# Altium footprint library WR-TBL_Pluggable PCB Header.PcbLib: 719 footprints (part 1 of 45)
Each footprint in its own frame and in the unit in brackets; x right, y up, seen from the top. Pads: shape width x height; smd on the part's side, far side on the other; paste and mask are expansions set on the pad; w line width, h text height; cw(c..) or ccw(c..) is an arc to the next point about the centre after c.
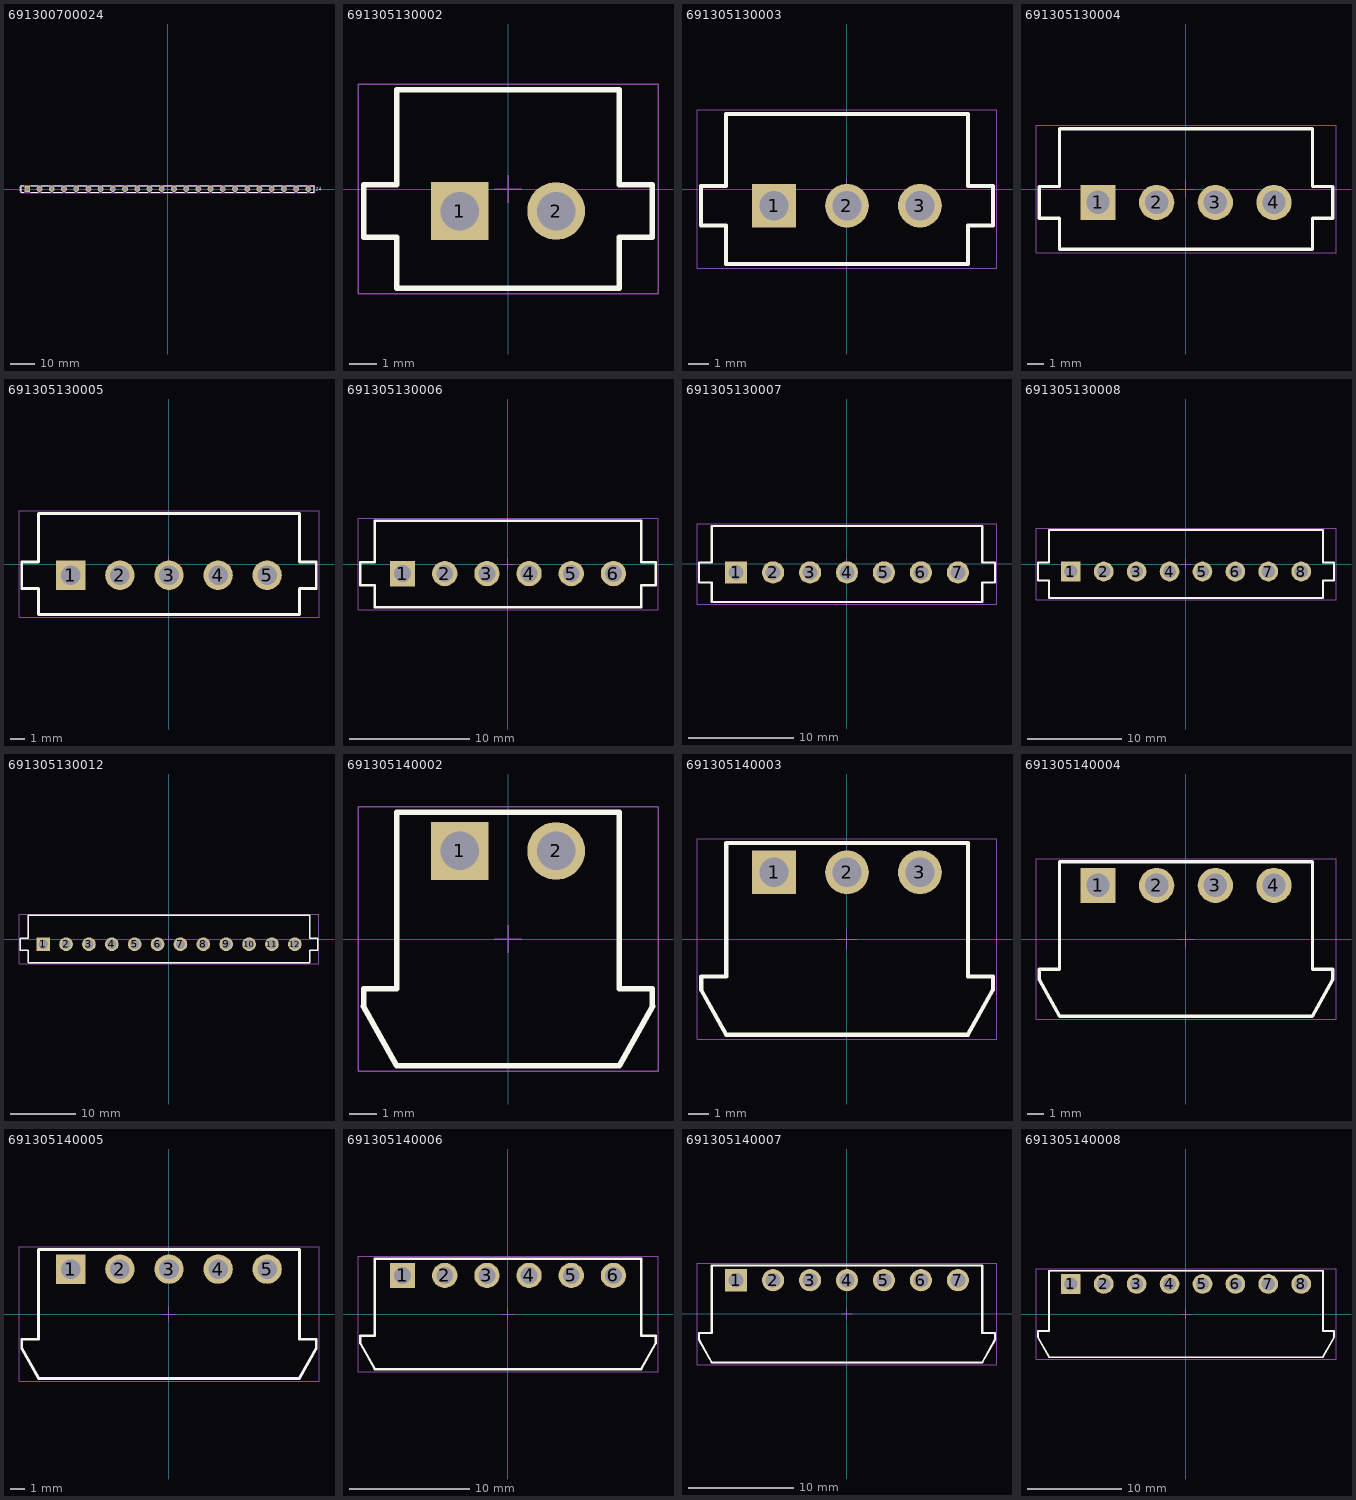
[diagram p0: the footprints below, top view; thin cyan lines are the x and y axes]

## 691300700024 [mm] "5.0mm pin header - 24p"
height 8.95
pads (24):
  rect 2.4x2.4 hole 1.6: 1(-57.5,0)
  round 2.4 hole 1.6: 2(-52.5,0) 3(-47.5,0) 4(-42.5,0) 5(-37.5,0) 6(-32.5,0) 7(-27.5,0) 8(-22.5,0) 9(-17.5,0) 10(-12.5,0) 11(-7.5,0) 12(-2.5,0) 13(2.5,0) 14(7.5,0) 15(12.5,0) 16(17.5,0) 17(22.5,0) 18(27.5,0) 19(32.5,0) 20(37.5,0) 21(42.5,0) 22(47.5,0) 23(52.5,0) 24(57.5,0)
Top Overlay:
  lines w0.2: -59,-1.35 -60,-1.35 -60,1.35 -59,1.35 ; -56,-1.35 -53.2,-1.35 ; -56,1.35 -53.2,1.35 ; -51.8,-1.35 -48.2,-1.35 ; -51.8,1.35 -48.2,1.35 ; -46.8,-1.35 -43.2,-1.35 ; -46.8,1.35 -43.2,1.35 ; -41.8,-1.35 -38.2,-1.35 ; -41.8,1.35 -38.2,1.35 ; -36.8,-1.35 -33.2,-1.35 ; -36.8,1.35 -33.2,1.35 ; -31.8,-1.35 -28.2,-1.35 ; -31.8,1.35 -28.2,1.35 ; -26.8,-1.35 -23.2,-1.35 ; -26.8,1.35 -23.2,1.35 ; -21.8,-1.35 -18.2,-1.35 ; -21.8,1.35 -18.2,1.35 ; -16.8,-1.35 -13.2,-1.35 ; -16.8,1.35 -13.2,1.35 ; -11.8,-1.35 -8.2,-1.35 ; -11.8,1.35 -8.2,1.35 ; -6.8,-1.35 -3.2,-1.35 ; -6.8,1.35 -3.2,1.35 ; -1.8,-1.35 1.8,-1.35 ; -1.8,1.35 1.8,1.35 ; 3.2,-1.35 6.8,-1.35 ; 3.2,1.35 6.8,1.35 ; 8.2,-1.35 11.8,-1.35 ; 8.2,1.35 11.8,1.35 ; 13.2,-1.35 16.8,-1.35 ; 13.2,1.35 16.8,1.35 ; 18.2,-1.35 21.8,-1.35 ; 18.2,1.35 21.8,1.35 ; 23.2,-1.35 26.8,-1.35 ; 23.2,1.35 26.8,1.35 ; 28.2,-1.35 31.8,-1.35 ; 28.2,1.35 31.8,1.35 ; 33.2,-1.35 36.8,-1.35 ; 33.2,1.35 36.8,1.35 ; 38.2,-1.35 41.8,-1.35 ; 38.2,1.35 41.8,1.35 ; 43.2,-1.35 46.8,-1.35 ; 43.2,1.35 46.8,1.35 ; 48.2,-1.35 51.8,-1.35 ; 48.2,1.35 51.8,1.35 ; 53.2,-1.35 56.8,-1.35 ; 53.2,1.35 56.8,1.35 ; 58.2,-1.35 60,-1.35 60,1.35 58.2,1.35
  text "24" at 60.6,-0.7 h1.27
  text "1" at -60.9,-0.7 h1.27
Mechanical 13:
  lines w0.1: 60,1.35 60,-1.35 -60,-1.35 -60,1.35 60,1.35 ; 60,1.35 60,1.35
Mechanical 15:
  lines w0.05: -0.5,0 0.5,0 ; 0,-0.5 0,0.5 ; -60.2,-1.55 60.2,-1.55 60.2,1.55 -60.2,1.55 -60.2,-1.55
3D body "691300700024.stp": height 9.05, standoff -3.45, extent -60,-1.35 60,1.35

## 691305130002 [mm] "Vertical PCB Header with Plastic Latch, pitch 3.5mm, 02p"
height 9.2
pads (2):
  rect 2.1x2.1 hole 1.4: 1(-1.75,-0.8)
  round 2.1 hole 1.4: 2(1.75,-0.8)
Top Overlay:
  lines w0.2: -5.25,-1.75 -5.25,0.15 -4.05,0.15 -4.05,3.6 4.05,3.6 4.05,0.15 5.25,0.15 5.25,-1.75 4.05,-1.75 4.05,-3.6 -4.05,-3.6 -4.05,-1.75 -5.25,-1.75
Mechanical 13:
  lines w0.1: -5.25,-1.75 -4.05,-1.75 -4.05,-3.6 4.05,-3.6 4.05,-1.75 5.25,-1.75 5.25,0.15 4.05,0.15 4.05,3.6 -4.05,3.6 -4.05,0.15 -5.25,0.15 -5.25,-1.75
Mechanical 15:
  lines w0.05: -0.5,0 0.5,0 ; 0,-0.5 0,0.5 ; -5.45,-3.8 -5.45,3.8 5.45,3.8 5.45,-3.8 -5.45,-3.8
3D body "691305130002.stp": height 9.25, standoff -3.45, extent -5.25,-3.6 5.25,3.6

## 691305130003 [mm] "Vertical PCB Header with Plastic Latch, pitch 3.5mm, 03p"
height 9.2
pads (3):
  rect 2.1x2.1 hole 1.4: 1(-3.5,-0.8)
  round 2.1 hole 1.4: 2(0,-0.8) 3(3.5,-0.8)
Top Overlay:
  lines w0.2: -7,-1.75 -7,0.15 -5.8,0.15 -5.8,3.6 5.8,3.6 5.8,0.15 7,0.15 7,-1.75 5.8,-1.75 5.8,-3.6 -5.8,-3.6 -5.8,-1.75 -7,-1.75
Mechanical 13:
  lines w0.1: -7,-1.75 -5.8,-1.75 -5.8,-3.6 5.8,-3.6 5.8,-1.75 7,-1.75 7,0.15 5.8,0.15 5.8,3.6 -5.8,3.6 -5.8,0.15 -7,0.15 -7,-1.75
Mechanical 15:
  lines w0.05: -0.5,0 0.5,0 ; 0,-0.5 0,0.5 ; -7.2,-3.8 -7.2,3.8 7.2,3.8 7.2,-3.8 -7.2,-3.8
3D body "691305130003.stp": height 9.25, standoff -3.5, extent -7,-3.6 7,3.6

## 691305130004 [mm] "Vertical PCB Header with Plastic Latch, pitch 3.5mm, 04p"
height 9.2
pads (4):
  rect 2.1x2.1 hole 1.4: 1(-5.25,-0.8)
  round 2.1 hole 1.4: 2(-1.75,-0.8) 3(1.75,-0.8) 4(5.25,-0.8)
Top Overlay:
  lines w0.2: -8.75,-1.75 -8.75,0.15 -7.55,0.15 -7.55,3.6 7.55,3.6 7.55,0.15 8.75,0.15 8.75,-1.75 7.55,-1.75 7.55,-3.6 -7.55,-3.6 -7.55,-1.75 -8.75,-1.75
Mechanical 13:
  lines w0.1: -8.75,-1.75 -7.55,-1.75 -7.55,-3.6 7.55,-3.6 7.55,-1.75 8.75,-1.75 8.75,0.15 7.55,0.15 7.55,3.6 -7.55,3.6 -7.55,0.15 -8.75,0.15 -8.75,-1.75
Mechanical 15:
  lines w0.05: -0.5,0 0.5,0 ; 0,-0.5 0,0.5 ; -8.95,-3.8 -8.95,3.8 8.95,3.8 8.95,-3.8 -8.95,-3.8
3D body "691305130004.stp": height 9.25, standoff -3.45, extent -8.75,-3.6 8.75,3.6

## 691305130005 [mm] "Vertical PCB Header with Plastic Latch, pitch 3.5mm, 05p"
height 9.2
pads (5):
  rect 2.1x2.1 hole 1.4: 1(-7,-0.8)
  round 2.1 hole 1.4: 2(-3.5,-0.8) 3(0,-0.8) 4(3.5,-0.8) 5(7,-0.8)
Top Overlay:
  lines w0.2: -10.5,-1.75 -10.5,0.15 -9.3,0.15 -9.3,3.6 9.3,3.6 9.3,0.15 10.5,0.15 10.5,-1.75 9.3,-1.75 9.3,-3.6 -9.3,-3.6 -9.3,-1.75 -10.5,-1.75
Mechanical 13:
  lines w0.1: -10.5,-1.75 -9.3,-1.75 -9.3,-3.6 9.3,-3.6 9.3,-1.75 10.5,-1.75 10.5,0.15 9.3,0.15 9.3,3.6 -9.3,3.6 -9.3,0.15 -10.5,0.15 -10.5,-1.75
Mechanical 15:
  lines w0.05: -0.5,0 0.5,0 ; 0,-0.5 0,0.5 ; -10.7,-3.8 -10.7,3.8 10.7,3.8 10.7,-3.8 -10.7,-3.8
3D body "691305130005.stp": height 9.25, standoff -3.5, extent -10.5,-3.6 10.5,3.6

## 691305130006 [mm] "Vertical PCB Header with Plastic Latch, pitch 3.5mm, 06p"
height 9.2
pads (6):
  rect 2.1x2.1 hole 1.4: 1(-8.75,-0.8)
  round 2.1 hole 1.4: 2(-5.25,-0.8) 3(-1.75,-0.8) 4(1.75,-0.8) 5(5.25,-0.8) 6(8.75,-0.8)
Top Overlay:
  lines w0.2: -12.25,-1.75 -12.25,0.15 -11.05,0.15 -11.05,3.6 11.05,3.6 11.05,0.15 12.25,0.15 12.25,-1.75 11.05,-1.75 11.05,-3.6 -11.05,-3.6 -11.05,-1.75 -12.25,-1.75
Mechanical 13:
  lines w0.1: -12.25,-1.75 -11.05,-1.75 -11.05,-3.6 11.05,-3.6 11.05,-1.75 12.25,-1.75 12.25,0.15 11.05,0.15 11.05,3.6 -11.05,3.6 -11.05,0.15 -12.25,0.15 -12.25,-1.75
Mechanical 15:
  lines w0.05: -0.5,0 0.5,0 ; 0,-0.5 0,0.5 ; -12.45,-3.8 -12.45,3.8 12.45,3.8 12.45,-3.8 -12.45,-3.8
3D body "691305130006.stp": height 9.25, standoff -3.5, extent -12.25,-3.6 12.25,3.6

## 691305130007 [mm] "Vertical PCB Header with Plastic Latch, pitch 3.5mm, 07p"
height 9.2
pads (7):
  rect 2.1x2.1 hole 1.4: 1(-10.5,-0.8)
  round 2.1 hole 1.4: 2(-7,-0.8) 3(-3.5,-0.8) 4(0,-0.8) 5(3.5,-0.8) 6(7,-0.8) 7(10.5,-0.8)
Top Overlay:
  lines w0.2: -14,-1.75 -12.8,-1.75 -12.8,-3.6 12.8,-3.6 12.8,-1.75 14,-1.75 14,0.15 12.8,0.15 12.8,3.6 -12.8,3.6 -12.8,0.15 -14,0.15 -14,-1.75
Mechanical 13:
  lines w0.1: -14,-1.75 -14,0.15 -12.8,0.15 -12.8,3.6 12.8,3.6 12.8,0.15 14,0.15 14,-1.75 12.8,-1.75 12.8,-3.6 -12.8,-3.6 -12.8,-1.75 -14,-1.75
Mechanical 15:
  lines w0.05: -0.5,0 0.5,0 ; 0,-0.5 0,0.5 ; -14.2,-3.8 14.2,-3.8 14.2,3.8 -14.2,3.8 -14.2,-3.8
3D body "691305130007.stp": height 9.25, standoff -3.45, extent -14,-3.6 14,3.6

## 691305130008 [mm] "Vertical PCB Header with Plastic Latch, pitch 3.5mm, 08p"
height 9.2
pads (8):
  rect 2.1x2.1 hole 1.4: 1(-12.25,-0.8)
  round 2.1 hole 1.4: 2(-8.75,-0.8) 3(-5.25,-0.8) 4(-1.75,-0.8) 5(1.75,-0.8) 6(5.25,-0.8) 7(8.75,-0.8) 8(12.25,-0.8)
Top Overlay:
  lines w0.2: -15.75,-1.75 -14.55,-1.75 -14.55,-3.6 14.55,-3.6 14.55,-1.75 15.75,-1.75 15.75,0.15 14.55,0.15 14.55,3.6 -14.55,3.6 -14.55,0.15 -15.75,0.15 -15.75,-1.75
Mechanical 13:
  lines w0.1: -15.75,-1.75 -15.75,0.15 -14.55,0.15 -14.55,3.6 14.55,3.6 14.55,0.15 15.75,0.15 15.75,-1.75 14.55,-1.75 14.55,-3.6 -14.55,-3.6 -14.55,-1.75 -15.75,-1.75
Mechanical 15:
  lines w0.05: -0.5,0 0.5,0 ; 0,-0.5 0,0.5 ; -15.95,-3.8 15.95,-3.8 15.95,3.8 -15.95,3.8 -15.95,-3.8
3D body "691305130008.stp": height 9.25, standoff -3.45, extent -15.75,-3.6 15.75,3.6

## 691305130012 [mm] "Vertical PCB Header with Plastic Latch, pitch 3.5mm, 12p"
height 9.2
pads (12):
  rect 2.1x2.1 hole 1.4: 1(-19.25,-0.8)
  round 2.1 hole 1.4: 2(-15.75,-0.8) 3(-12.25,-0.8) 4(-8.75,-0.8) 5(-5.25,-0.8) 6(-1.75,-0.8) 7(1.75,-0.8) 8(5.25,-0.8) 9(8.75,-0.8) 10(12.25,-0.8) 11(15.75,-0.8) 12(19.25,-0.8)
Top Overlay:
  lines w0.2: -22.75,-1.75 -22.75,0.15 -21.55,0.15 -21.55,3.6 21.55,3.6 21.55,0.15 22.75,0.15 22.75,-1.75 21.55,-1.75 21.55,-3.6 -21.55,-3.6 -21.55,-1.75 -22.75,-1.75
Mechanical 13:
  lines w0.1: -22.75,-1.75 -21.55,-1.75 -21.55,-3.6 21.55,-3.6 21.55,-1.75 22.75,-1.75 22.75,0.15 21.55,0.15 21.55,3.6 -21.55,3.6 -21.55,0.15 -22.75,0.15 -22.75,-1.75
Mechanical 15:
  lines w0.05: -0.5,0 0.5,0 ; 0,-0.5 0,0.5 ; -22.95,-3.8 -22.95,3.8 22.95,3.8 22.95,-3.8 -22.95,-3.8
3D body "691305130012.stp": height 9.25, standoff -3.45, extent -22.75,-3.6 22.75,3.6

## 691305140002 [mm] "Horizontal PCB Header with Plastic Latch, pitch 3.5mm, 02p"
height 7
pads (2):
  rect 2.1x2.1 hole 1.4: 1(-1.75,3.2)
  round 2.1 hole 1.4: 2(1.75,3.2)
Top Overlay:
  lines w0.2: -5.251,-2.451 -4.05,-4.6 4.05,-4.6 5.251,-2.451 ; -5.25,-2.45 -5.25,-1.8 -4.05,-1.8 -4.05,4.6 4.05,4.6 4.05,-1.8 5.25,-1.8 5.25,-2.45
Mechanical 13:
  lines w0.1: -5.251,-2.451 -4.05,-4.6 4.05,-4.6 5.251,-2.451 ; -5.25,-2.45 -5.25,-1.8 -4.05,-1.8 -4.05,4.6 4.05,4.6 4.05,-1.8 5.25,-1.8 5.25,-2.45
Mechanical 15:
  lines w0.05: -0.5,0 0.5,0 ; 0,-0.5 0,0.5 ; -5.45,-4.8 -5.45,4.8 5.45,4.8 5.45,-4.8 -5.45,-4.8
3D body "691305140002.stp": height 7.25, standoff -3.45, extent -5.25,-4.6 5.25,4.6

## 691305140003 [mm] "Horizontal PCB Header with Plastic Latch, pitch 3.5mm, 03p"
height 7
pads (3):
  rect 2.1x2.1 hole 1.4: 1(-3.5,3.2)
  round 2.1 hole 1.4: 2(0,3.2) 3(3.5,3.2)
Top Overlay:
  lines w0.2: -7.001,-2.451 -5.8,-4.6 5.8,-4.6 7.001,-2.451 ; -7,-2.45 -7,-1.8 -5.8,-1.8 -5.8,4.6 5.8,4.6 5.8,-1.8 7,-1.8 7,-2.45
Mechanical 13:
  lines w0.1: -7.001,-2.451 -5.8,-4.6 5.8,-4.6 7.001,-2.451 ; -7,-2.45 -7,-1.8 -5.8,-1.8 -5.8,4.6 5.8,4.6 5.8,-1.8 7,-1.8 7,-2.45
Mechanical 15:
  lines w0.05: -0.5,0 0.5,0 ; 0,-0.5 0,0.5 ; -7.2,-4.8 7.2,-4.8 7.2,4.8 -7.2,4.8 -7.2,-4.8
3D body "691305140003.stp": height 7.25, standoff -3.45, extent -7,-4.6 7,4.6

## 691305140004 [mm] "Horizontal PCB Header with Plastic Latch, pitch 3.5mm, 04p"
height 7
pads (4):
  rect 2.1x2.1 hole 1.4: 1(-5.25,3.2)
  round 2.1 hole 1.4: 2(-1.75,3.2) 3(1.75,3.2) 4(5.25,3.2)
Top Overlay:
  lines w0.2: -8.751,-2.451 -7.55,-4.6 7.55,-4.6 8.751,-2.451 ; -8.75,-2.45 -8.75,-1.8 -7.55,-1.8 -7.55,4.6 7.55,4.6 7.55,-1.8 8.75,-1.8 8.75,-2.45
Mechanical 13:
  lines w0.1: -8.751,-2.451 -7.55,-4.6 7.55,-4.6 8.751,-2.451 ; -8.75,-2.45 -8.75,-1.8 -7.55,-1.8 -7.55,4.6 7.55,4.6 7.55,-1.8 8.75,-1.8 8.75,-2.45
Mechanical 15:
  lines w0.05: -0.5,0 0.5,0 ; 0,-0.5 0,0.5 ; -8.95,-4.8 8.95,-4.8 8.95,4.8 -8.95,4.8 -8.95,-4.8
3D body "691305140004.stp": height 7.25, standoff -3.45, extent -8.75,-4.6 8.75,4.6

## 691305140005 [mm] "Horizontal PCB Header with Plastic Latch, pitch 3.5mm, 05p"
height 7
pads (5):
  rect 2.1x2.1 hole 1.4: 1(-7,3.2)
  round 2.1 hole 1.4: 2(-3.5,3.2) 3(0,3.2) 4(3.5,3.2) 5(7,3.2)
Top Overlay:
  lines w0.2: -10.501,-2.451 -9.3,-4.6 9.3,-4.6 10.501,-2.451 ; -10.5,-2.45 -10.5,-1.8 -9.3,-1.8 -9.3,4.6 9.3,4.6 9.3,-1.8 10.5,-1.8 10.5,-2.45
Mechanical 13:
  lines w0.1: -10.501,-2.451 -9.3,-4.6 9.3,-4.6 10.501,-2.451 ; -10.5,-2.45 -10.5,-1.8 -9.3,-1.8 -9.3,4.6 9.3,4.6 9.3,-1.8 10.5,-1.8 10.5,-2.45
Mechanical 15:
  lines w0.05: -0.5,0 0.5,0 ; 0,-0.5 0,0.5 ; -10.7,-4.8 10.7,-4.8 10.7,4.8 -10.7,4.8 -10.7,-4.8
3D body "691305140005.stp": height 7.25, standoff -3.45, extent -10.5,-4.6 10.5,4.6

## 691305140006 [mm] "Horizontal PCB Header with Plastic Latch, pitch 3.5mm, 06p"
height 7
pads (6):
  rect 2.1x2.1 hole 1.4: 1(-8.75,3.2)
  round 2.1 hole 1.4: 2(-5.25,3.2) 3(-1.75,3.2) 4(1.75,3.2) 5(5.25,3.2) 6(8.75,3.2)
Top Overlay:
  lines w0.2: -12.251,-2.451 -11.05,-4.6 11.05,-4.6 12.251,-2.451 ; -12.25,-2.45 -12.25,-1.8 -11.05,-1.8 -11.05,4.6 11.05,4.6 11.05,-1.8 12.25,-1.8 12.25,-2.45
Mechanical 13:
  lines w0.1: -12.251,-2.451 -11.05,-4.6 11.05,-4.6 12.251,-2.451 ; -12.25,-2.45 -12.25,-1.8 -11.05,-1.8 -11.05,4.6 11.05,4.6 11.05,-1.8 12.25,-1.8 12.25,-2.45
Mechanical 15:
  lines w0.05: -0.5,0 0.5,0 ; 0,-0.5 0,0.5 ; -12.45,-4.8 -12.45,4.8 12.45,4.8 12.45,-4.8 -12.45,-4.8
3D body "691305140006.stp": height 7.25, standoff -3.45, extent -12.25,-4.6 12.25,4.6

## 691305140007 [mm] "Horizontal PCB Header with Plastic Latch, pitch 3.5mm, 07p"
height 7
pads (7):
  rect 2.1x2.1 hole 1.4: 1(-10.5,3.2)
  round 2.1 hole 1.4: 2(-7,3.2) 3(-3.5,3.2) 4(0,3.2) 5(3.5,3.2) 6(7,3.2) 7(10.5,3.2)
Top Overlay:
  lines w0.2: -14.001,-2.451 -12.8,-4.6 12.8,-4.6 14.001,-2.451 ; -14,-2.45 -14,-1.8 -12.8,-1.8 -12.8,4.6 12.8,4.6 12.8,-1.8 14,-1.8 14,-2.45
Mechanical 13:
  lines w0.1: -14.001,-2.451 -12.8,-4.6 12.8,-4.6 14.001,-2.451 ; -14,-2.45 -14,-1.8 -12.8,-1.8 -12.8,4.6 12.8,4.6 12.8,-1.8 14,-1.8 14,-2.45
Mechanical 15:
  lines w0.05: -0.5,0 0.5,0 ; 0,-0.5 0,0.5 ; -14.2,-4.8 -14.2,4.8 14.2,4.8 14.2,-4.8 -14.2,-4.8
3D body "691305140007.stp": height 7.25, standoff -3.45, extent -14,-4.6 14,4.6

## 691305140008 [mm] "Horizontal PCB Header with Plastic Latch, pitch 3.5mm, 08p"
height 7
pads (8):
  rect 2.1x2.1 hole 1.4: 1(-12.25,3.2)
  round 2.1 hole 1.4: 2(-8.75,3.2) 3(-5.25,3.2) 4(-1.75,3.2) 5(1.75,3.2) 6(5.25,3.2) 7(8.75,3.2) 8(12.25,3.2)
Top Overlay:
  lines w0.2: -15.751,-2.451 -14.55,-4.6 14.55,-4.6 15.751,-2.451 ; -15.75,-2.45 -15.75,-1.8 -14.55,-1.8 -14.55,4.6 14.55,4.6 14.55,-1.8 15.75,-1.8 15.75,-2.45
Mechanical 13:
  lines w0.1: -15.751,-2.451 -14.55,-4.6 14.55,-4.6 15.751,-2.451 ; -15.75,-2.45 -15.75,-1.8 -14.55,-1.8 -14.55,4.6 14.55,4.6 14.55,-1.8 15.75,-1.8 15.75,-2.45
Mechanical 15:
  lines w0.05: -0.5,0 0.5,0 ; 0,-0.5 0,0.5 ; -15.95,-4.8 -15.95,4.8 15.95,4.8 15.95,-4.8 -15.95,-4.8
3D body "691305140008.stp": height 7.25, standoff -3.45, extent -15.75,-4.6 15.75,4.6